# Altium integrated library HoangLong_Library.IntLib: 32 symbols
Pins are listed as number, name and electrical type; pins without a type are passive.

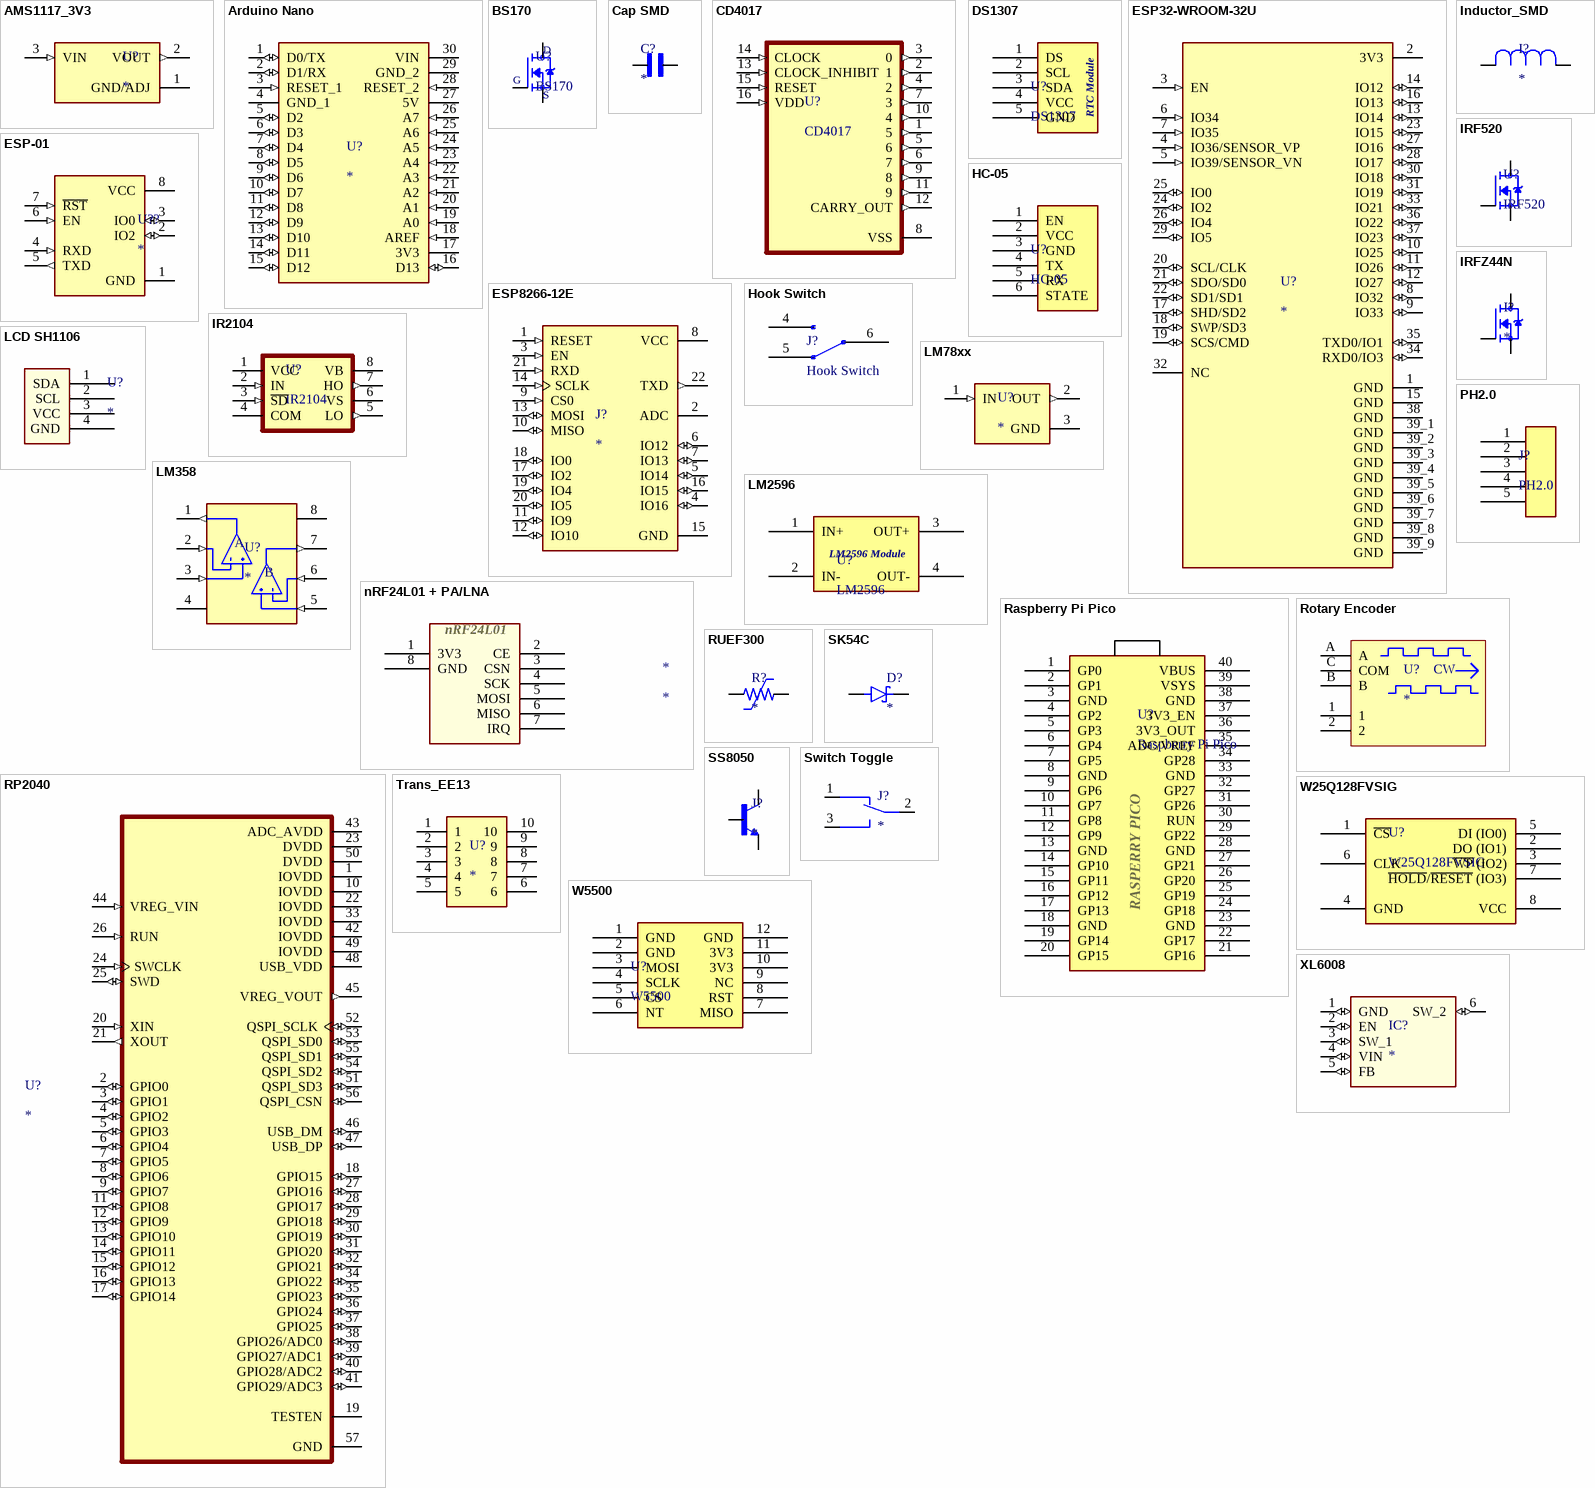
[diagram p0: symbols AMS1117_3V3 to XL6008]

## AMS1117_3V3
designator U?
footprint AMS1117_3v3
pins: 1 GND/ADJ (power), 2 VOUT (out), 3 VIN (in)

## Arduino Nano
designator U?
ATSAMD21G18A Arduino Nano 33 IoT series ARMÂ® CortexÂ®-M0+ MCU 32-Bit Embedded Evaluation Board
footprint Arduino Nano
pins: 1 D0/TX (io), 2 D1/RX (io), 3 RESET_1 (in), 4 GND_1 (power), 5 D2 (io), 6 D3 (io), 7 D4 (io), 8 D5 (io), 9 D6 (io), 10 D7 (io), 11 D8 (io), 12 D9 (io), 13 D10 (io), 14 D11 (io), 15 D12 (io), 16 D13 (io), 17 3V3 (power), 18 AREF (in), 19 A0 (in), 20 A1 (in), 21 A2 (in), 22 A3 (in), 23 A4 (in), 24 A5 (in), 25 A6 (in), 26 A7 (in), 27 5V (power), 28 RESET_2 (in), 29 GND_2 (power), 30 VIN (power)

## BS170
designator U?
BS170 MOSFET N-CH 60V 500mA
footprint BS170 (BS170 MOSFET N-CH 60V 500mA)
pins: 1 G, 2 D, 3 S

## Cap SMD
designator C?
Cap Ceramic
footprint Cap 10uF 35V 1210
footprint Cap 100nF 50V 1206
pins: 1, 2

## CD4017
designator U?
SMD
footprint CD4017 (SMD)
pins: 1 5 (out), 2 1 (out), 3 0 (out), 4 2 (out), 5 6 (out), 6 7 (out), 7 3 (out), 8 VSS (power), 9 8 (out), 10 4 (out), 11 9 (out), 12 CARRY_OUT (out), 13 CLOCK_INHIBIT (in), 14 CLOCK (in), 15 RESET (in), 16 VDD (in)

## DS1307
designator U?
RTC Module DS1307
footprint DS1307
pins: 1 DS, 2 SCL, 3 SDA, 4 VCC, 5 GND
text: RTC Module

## ESP32-WROOM-32U
designator U?
Bluetooth, WiFi 802.11b/g/n, Bluetooth v4.2 +EDR, Class 1, 2 and 3 Transceiver Module 2.4GHz ~ 2.5GHz Antenna Not Included, U.FL Surface Mount
footprint ESP32-WROOM-32U
pins: 1 GND (power), 2 3V3 (power), 3 EN (in), 4 IO36/SENSOR_VP (in), 5 IO39/SENSOR_VN (in), 6 IO34 (in), 7 IO35 (in), 8 IO32 (io), 9 IO33 (io), 10 IO25 (io), 11 IO26 (io), 12 IO27 (io), 13 IO14 (io), 14 IO12 (io), 15 GND (power), 16 IO13 (io), 17 SHD/SD2 (io), 18 SWP/SD3 (io), 19 SCS/CMD (io), 20 SCL/CLK (io), 21 SDO/SD0 (io), 22 SD1/SD1 (io), 23 IO15 (io), 24 IO2 (io), 25 IO0 (io), 26 IO4 (io), 27 IO16 (io), 28 IO17 (io), 29 IO5 (io), 30 IO18 (io), 31 IO19 (io), 32 NC, 33 IO21 (io), 34 RXD0/IO3 (io), 35 TXD0/IO1 (io), 36 IO22 (io), 37 IO23 (io), 38 GND (power), 39_1 GND (power), 39_2 GND (power), 39_3 GND (power), 39_4 GND (power), 39_5 GND (power), 39_6 GND (power), 39_7 GND (power), 39_8 GND (power), 39_9 GND (power)

## ESP8266-12E
designator J?
ESP-12E ESP8266 AI-Thinker Mạch Thu Phát WiFi
footprint ESP8266-12E
pins: 1 RESET (in), 2 ADC, 3 EN (in), 4 IO16 (io), 5 IO14 (io), 6 IO12 (io), 7 IO13 (io), 8 VCC (power), 9 CS0 (in), 10 MISO (io), 11 IO9 (io), 12 IO10 (io), 13 MOSI (io), 14 SCLK (in), 15 GND (power), 16 IO15 (io), 17 IO2 (io), 18 IO0 (io), 19 IO4 (io), 20 IO5 (io), 21 RXD (in), 22 TXD (out)

## ESP-01
designator U??
ESP-01 Serial Wireless WiFi Transceiver Receiver Module 1MB SPI Flash DC3.0-3.6V
footprint ESP-01
pins: 1 GND (power), 2 IO2 (io), 3 IO0 (io), 4 RXD (in), 5 TXD (out), 6 EN (in), 7 ~{RST} (in), 8 VCC (power)

## HC-05
designator U?
Bluetooth Module HC-05
footprint HC-05
pins: 1 EN, 2 VCC, 3 GND, 4 TX, 5 RX, 6 STATE

## Hook Switch
designator J?
Telephone Switch
footprint Hook Switch
pins: 4, 5, 6

## Inductor_SMD
designator I?
CDRH127
footprint Inductor-CDRH127
pins: 1, 2

## IR2104
designator U?
IR2104SPBF MOSFET 2 Ngõ Ra, 360 mA, 20V 8-SOIC
footprint IR2104 (IR2104SPBF MOSFET 2 Ngõ Ra, 360 mA, 20V 8-SOIC)
pins: 1 VCC (power), 2 IN (in), 3 ~{SD} (in), 4 COM, 5 LO (out), 6 VS (power), 7 HO (out), 8 VB (power)

## IRF520
designator U?
IRF520NPBF MOSFET Kênh N 100V 9.7A
footprint IRF520 (SMD)
pins: 1 G, 2 D, 3 S

## IRFZ44N
designator I?
RoHS Compliant | Low RDS(on) | Industry-leading quality | Dynamic dv/dt Rating | Fast Switching | Fully Avalanche Rated | 175C Operating Temperature
footprint TO-263 aka D2PAK
pins: 1 G, 2 D, 3 S

## LCD SH1106
designator U?
footprint LCD SH1106
pins: 1 SDA, 2 SCL, 3 VCC, 4 GND

## LM78xx
designator U?
Linear Voltage Regulator IC Positive Fixed 1 Output 1.5A D2PAK
footprint QTO220-H1
footprint QTO220-H2
footprint TO-263
pins: 1 IN (in), 2 OUT (out), 3 GND (power)

## LM358
designator U?
Dual standard operational amplifier 8-SOIC 0 to 70
footprint LM358 SOIC-8
pins: 1 OUT1 (out), 2 IN1- (in), 3 IN1+ (in), 4 V- (power), 5 IN2+ (in), 6 IN2- (in), 7 OUT2 (out), 8 V+ (power)
text: A; B

## LM2596
designator U?
DC-DC Buck Converter
footprint LM2596
pins: 1 IN+, 2 IN-, 3 OUT+, 4 OUT-
text: LM2596 Module

## nRF24L01 + PA/LNA
designator *
footprint nRF24L01 + PA/LNA
pins: 1 3V3, 2 CE, 3 CSN, 4 SCK, 5 MOSI, 6 MISO, 7 IRQ, 8 GND
text: nRF24L01

## PH2.0
designator J?
Connector PH2.0 5 pins
footprint PH2.0
pins: 1, 2, 3, 4, 5

## Raspberry Pi Pico
designator U?
Raspberry Pi Pico Pins Down
footprint Raspberry Pi Pico
pins: 1 GP0, 2 GP1, 3 GND, 4 GP2, 5 GP3, 6 GP4, 7 GP5, 8 GND, 9 GP6, 10 GP7, 11 GP8, 12 GP9, 13 GND, 14 GP10, 15 GP11, 16 GP12, 17 GP13, 18 GND, 19 GP14, 20 GP15, 21 GP16, 22 GP17, 23 GND, 24 GP18, 25 GP19, 26 GP20, 27 GP21, 28 GND, 29 GP22, 30 RUN, 31 GP26, 32 GP27, 33 GND, 34 GP28, 35 ADC/VREF, 36 3V3_OUT, 37 3V3_EN, 38 GND, 39 VSYS, 40 VBUS
text: RASPERRY PICO

## Rotary Encoder
designator U?
WS-ENTV Mechanical Incremental Encoder Switch, Metal Shaft with bushing, 8Pulse/360°, 16positions, 1
footprint Rotary Encoder
pins: 1, 2, A "Channel A", B "Channel B", C COM "Common"
text: CW

## RP2040
designator U?
RP2040 chip for Raspberry Pi Pico - ARM® Cortex®-M0+ MCU 32-Bit
footprint RP2040_Pico_SMD
pins: 1 IOVDD (power), 2 GPIO0 (io), 3 GPIO1 (io), 4 GPIO2 (io), 5 GPIO3 (io), 6 GPIO4 (io), 7 GPIO5 (io), 8 GPIO6 (io), 9 GPIO7 (io), 10 IOVDD (power), 11 GPIO8 (io), 12 GPIO9 (io), 13 GPIO10 (io), 14 GPIO11 (io), 15 GPIO12 (io), 16 GPIO13 (io), 17 GPIO14 (io), 18 GPIO15 (io), 19 TESTEN, 20 XIN (in), 21 XOUT (out), 22 IOVDD (power), 23 DVDD (power), 24 SWCLK (in), 25 SWD (io), 26 RUN (in), 27 GPIO16 (io), 28 GPIO17 (io), 29 GPIO18 (io), 30 GPIO19 (io), 31 GPIO20 (io), 32 GPIO21 (io), 33 IOVDD (power), 34 GPIO22 (io), 35 GPIO23 (io), 36 GPIO24 (io), 37 GPIO25 (io), 38 GPIO26/ADC0 (io), 39 GPIO27/ADC1 (io), 40 GPIO28/ADC2 (io), 41 GPIO29/ADC3 (io), 42 IOVDD (power), 43 ADC_AVDD (power), 44 VREG_VIN (in), 45 VREG_VOUT (out), 46 USB_DM (io), 47 USB_DP (io), 48 USB_VDD (power), 49 IOVDD (power), 50 DVDD (power), 51 QSPI_SD3 (io), 52 QSPI_SCLK (io), 53 QSPI_SD0 (io), 54 QSPI_SD2 (io), 55 QSPI_SD1 (io), 56 QSPI_CSN (io), 57 GND (power)

## RUEF300
designator R?
Polymeric PTC Resettable Fuse 30V 3 A Ih Through Hole Radial, Disc
footprint RUEF300
pins: P$1 1, P$2 2

## SK54C
designator D?
Diode 5A 40V
footprint SK54C (Diode)
pins: A, C K

## SS8050
designator J?
Bipolar (BJT) Transistor NPN 25 V 1.5 A 100MHz 300 mW Surface Mount SOT-23-3
footprint SS8050
pins: 1 B, 2 E, 3 C

## Switch Toggle
designator J?
Switch Toggle On-Off
footprint Switch Toggle ON
footprint Switch toggle_2
pins: 1, 2, 3

## Trans_EE13
designator U?
TRANSFORMER EE13
footprint Transformer_EE13
pins: 1, 2, 3, 4, 5, 6, 7, 8, 9, 10

## W25Q128FVSIG
designator U?
footprint W25Q128FVSIG
pins: 1 ~{CS}, 2 DO (IO1), 3 ~{WP} (IO2), 4 GND, 5 DI (IO0), 6 CLK, 7 ~{HOLD}/~{RESET} (IO3), 8 VCC

## W5500
designator U?
USR-E1 W5500
footprint W5500
pins: 1 GND, 2 GND, 3 MOSI, 4 SCLK, 5 CS, 6 NT, 7 MISO, 8 RST, 9 NC, 10 3V3, 11 3V3, 12 GND

## XL6008
designator IC?
The XL6008 regulator is a wide input range, current mode, DC/DC converter which is capable of generating either positive or negative output voltages.
footprint XL6008
pins: 1 GND (io), 2 EN (io), 3 SW_1 (io), 4 VIN (io), 5 FB (io), 6 SW_2 (io)